# Altium footprint library Bison-Board.PcbLib: 101 footprints (part 1 of 7)
Each footprint in its own frame and in the unit in brackets; x right, y up, seen from the top. Pads: shape width x height; smd on the part's side, far side on the other; paste and mask are expansions set on the pad; w line width, h text height; cw(c..) or ccw(c..) is an arc to the next point about the centre after c.
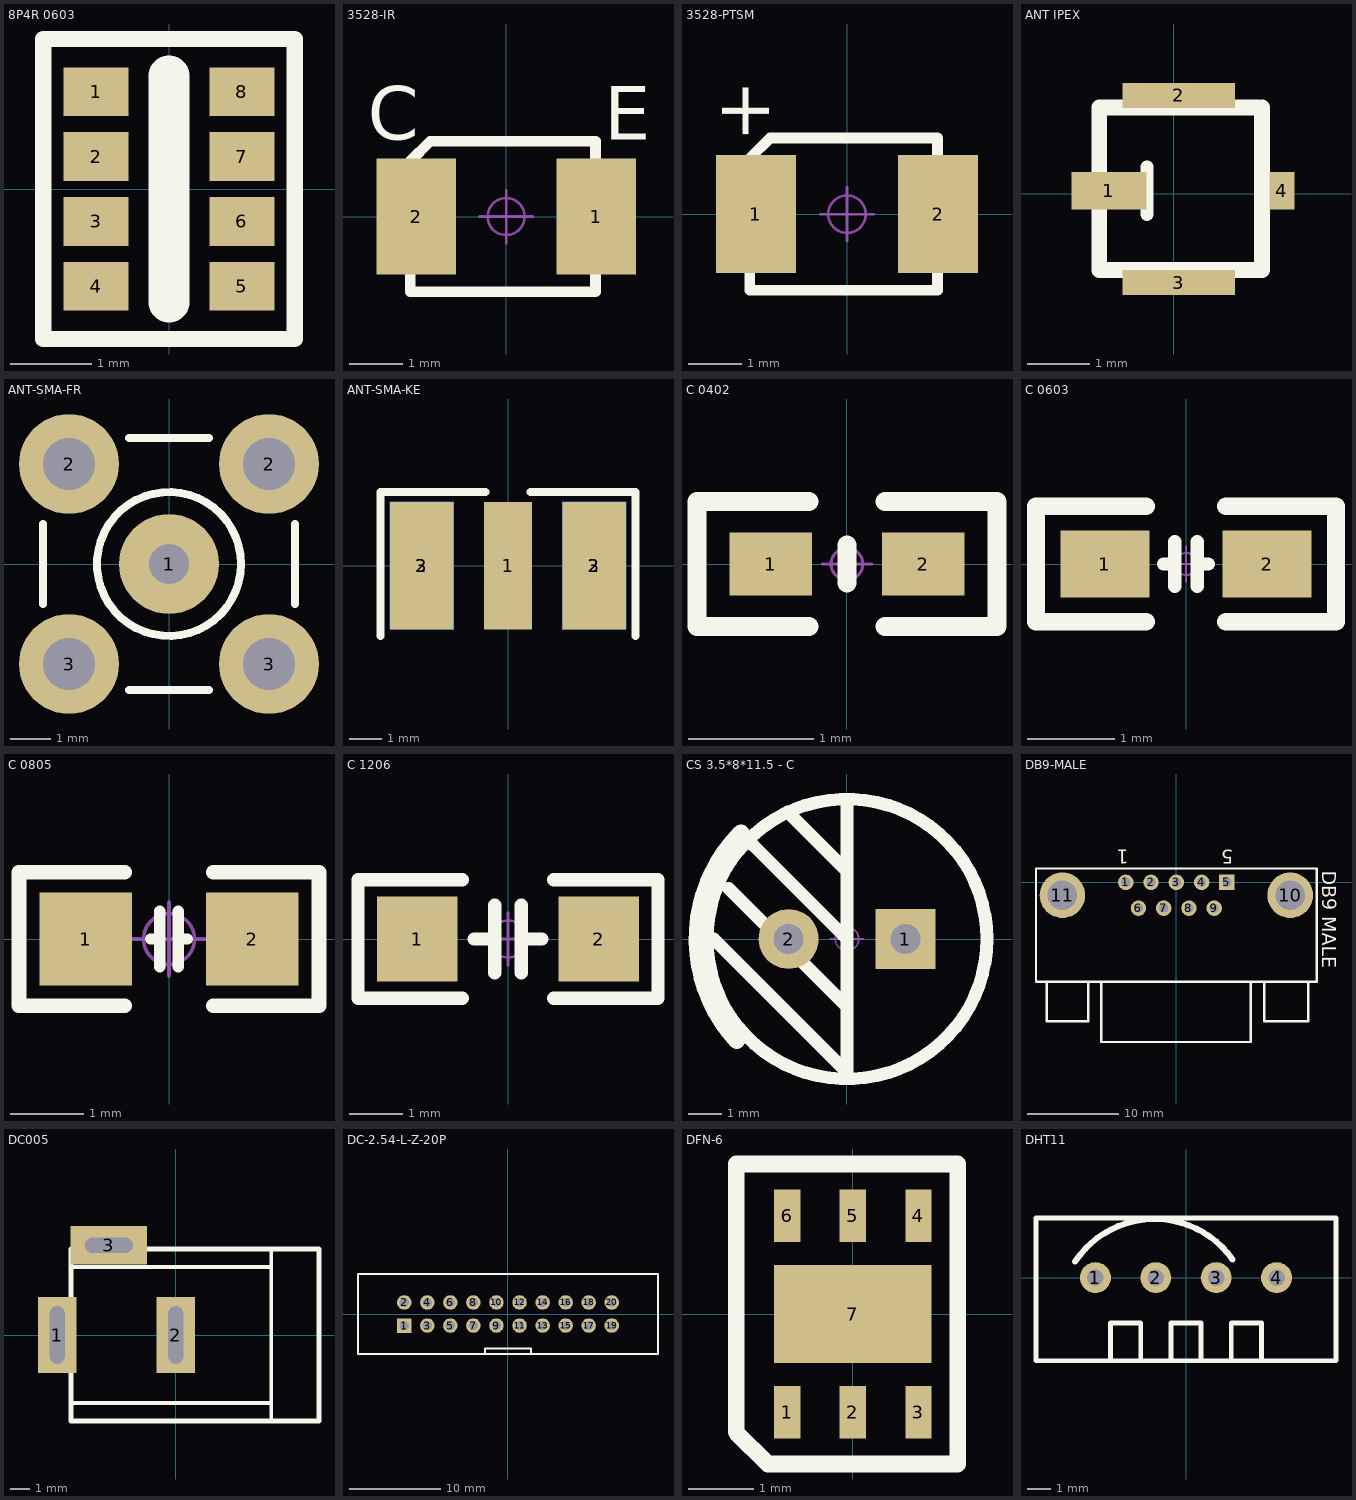
[diagram p0: the footprints below, top view; thin cyan lines are the x and y axes]

## 8P4R 0603 [mm]
pads (8):
  rect 0.8x0.6 smd: 1(-0.9,1.2) 2(-0.9,0.4) 3(-0.9,-0.4) 4(-0.9,-1.2) 5(0.9,-1.2) 6(0.9,-0.4) 7(0.9,0.4) 8(0.9,1.2)
Top Overlay:
  lines w0.2: -1.55,-1.85 1.55,-1.85 1.55,1.85 -1.55,1.85 -1.55,-1.85
  lines w0.5: 0,-1.397 0,1.397
3D body "8P4R-0603.SLDPRT": height 0.6, standoff 0, extent -0.863,-1.6 0.737,1.6

## 3528-IR [mm] "3528-2P封装的红外接收管"
pads (2):
  rect 1.5x2.2 smd: 1(1.7,0) 2(-1.7,0)
Top Overlay:
  lines w0.2: -1.816,-1.422 1.689,-1.422 1.689,1.422 -1.435,1.422 -1.816,1.041 -1.816,-1.422
  text "C" at -2.616,1.448 h1.02
  text "E" at 1.854,1.448 h1.02
Mechanical 15:
  circle w0.05: c0,0 r0.35
  lines w0.05: -0.5,0 0.5,0 ; 0,-0.5 0,0.5
3D body "LED 3528-2Pin 基体.STEP": height 1.95, standoff 0.05, extent -1.75,-1.4 1.75,1.4
3D body "LED 3528 透明胶.STEP": height 1.95, standoff 1.2, extent -1.195,-1.195 1.195,1.195

## 3528-PTSM [mm] "3528-2P封装的光环境传感器"
pads (2):
  rect 1.5x2.2 smd: 1(-1.7,0) 2(1.7,0)
Top Overlay:
  lines w0.2: -1.816,-1.422 1.689,-1.422 1.689,1.422 -1.435,1.422 -1.816,1.041 -1.816,-1.422
  text "+" at -1.448,1.346 h1.02
Mechanical 15:
  circle w0.05: c0,0 r0.35
  lines w0.05: -0.5,0 0.5,0 ; 0,-0.5 0,0.5
3D body "LED 3528-2Pin 基体.STEP": height 1.95, standoff 0.05, extent -1.75,-1.4 1.75,1.4
3D body "LED 3528 透明胶.STEP": height 1.95, standoff 1.2, extent -1.195,-1.195 1.195,1.195

## ANT IPEX [mm]
pads (4):
  rect 1.2x0.6 smd: 1(-1.041,0.051)
  rect 1.8x0.4 smd: 2(0.076,1.575) 3(0.076,-1.422)
  rect 0.4x0.6 smd: 4(1.727,0.051)
Top Overlay:
  lines w0.203: -1.067,0.051 -0.559,0.051 ; -0.432,-0.33 -0.432,0.432
  lines w0.254: 1.339,1.381 -1.194,1.381 -1.194,-1.219 1.406,-1.219 1.406,1.381
3D body "IPEX.SLDPRT": height 1.25, standoff 0, extent -1.473,-1.499 1.627,1.601

## ANT-SMA-FR [mm] "SMA天线座90度"
pads (5):
  round 2.5 hole 1: 1(0,0)
  round 2.5 hole 1.3: 2(-2.5,2.5) 2(2.5,2.5) 3(-2.5,-2.5) 3(2.5,-2.5)
Top Overlay:
  circle w0.2: c0,0 r1.8
  lines w0.2: -3.15,-1 -3.15,1 ; -1,-3.15 1,-3.15 ; -1,3.15 1,3.15 ; 3.15,-1 3.15,1
Mechanical 1:
  circle w0.025: c0,0 r0.2
  circle w0.025: c0,0 r1.05
  circle w0.025: c0,0 r1.8
3D body "Samtec-SMA-J-P-H-RA-TH1.STEP": height 10.26, standoff -3.84, extent -3.5,-3.5 3.5,11.6

## ANT-SMA-KE [mm]
pads (5):
  rect 1.5x4 smd: 1(0,0)
  rect 2x4 smd: 2(-2.7,0) 2(2.7,0)
  rect 2x4 smd far side: 3(-2.7,0) 3(2.7,0)
Top Overlay:
  lines w0.254: -4,-2.2 -4,2.3 -0.7,2.3 ; 0.7,2.3 4,2.3 4,-2.2
3D body "SMA-KE.STEP": height 3.75, standoff -2.76, extent -3.25,-1.3 3.25,12.2

## C 0402 [mil]
pads (2):
  rect 26x20 smd: 1(-24,0) 2(24,0)
Top Overlay:
  lines w6: -12,-19.68 -47.24,-19.68 -47.24,19.69 -12,19.69 ; 0,-6 0,6 ; 12,-19.68 47.25,-19.68 47.25,19.69 12,19.69
Mechanical 15:
  circle w1: c0,0 r5
  lines w1: -7.87,0 7.88,0 ; 0,-7.87 0,7.88
3D body "C0402.SLDPRT": height 12.2, standoff -0.39, extent -19.69,-10.24 19.68,10.23

## C 0603 [mil]
pads (2):
  rect 40x30 smd: 1(-36.5,0) 2(36.5,0)
Top Overlay:
  lines w6: -10,0 -5,0 ; -5,-10 -5,10 ; 5,-10 5,10 ; 5,0 10,0
  lines w8: -18,-26 -67.5,-26 -67.5,26 -18,26 ; 18,-26 67.5,-26 67.5,26 18,26
Mechanical 15:
  circle w1: c0,0 r5
  lines w1: -7.87,0 7.87,0 ; 0,-7.87 0,7.87
3D body "C0603.SLDPRT": height 16.54, standoff -0.79, extent -34.43,-17.07 36.43,16

## C 0805 [mil]
pads (2):
  rect 50x50 smd: 1(-45,0) 2(45,0)
Top Overlay:
  lines w6: -10,0 -5,0 ; -5,-15 -5,15 ; 5,-15 5,15 ; 5,0 10,0
  lines w8: -24,-36 -81,-36 -81,36 -24,36 ; 24,-36 81,-36 81,36 24,36
Mechanical 15:
  circle w1.97: c0,0 r13.78
  lines w1.97: -19.68,0 19.68,0 ; 0,-19.68 0,19.68
3D body "C0805.SLDPRT": height 20.08, standoff -0.39, extent -39.37,-25 39.37,25

## C 1206 [mil]
pads (2):
  rect 60x62.99 smd: 1(-67.5,0) 2(67.5,0)
Top Overlay:
  lines w10: -34,-44 -111.5,-44 -111.5,44 -34,44 ; -25,0 -10,0 ; -10,-25 -10,25 ; 10,-25 10,25 ; 10,0 25,0 ; 34,-44 111.5,-44 111.5,44 34,44
Mechanical 15:
  circle w1.97: c0,0 r13.78
  lines w1.97: -19.68,0 19.68,0 ; 0,-19.68 0,19.68
3D body "C 1206.STEP": height 47.64, standoff -0.39, extent -62.99,-31.89 62.99,31.89

## CS 3.5*8*11.5 - C [mm] "脚距3.5mm , 直径8mm , 高11.5mm"
pads (2):
  rect 1.8x1.8 hole 0.9: 1(1.75,0)
  round 1.8 hole 0.9: 2(-1.75,0)
Top Overlay:
  circle w0.381: c0,0 r4.2
  lines w0.381: -4,0 0,-4 0,4 ; -3.556,1.524 0,-2.032 ; -2.807,2.807 0,0 ; -1.778,3.81 0,2.032
  lines w0.504: -3.307,-3.053 cw(c0,0) -3.183,3.183
Mechanical 15:
  circle w0.05: c0,0 r0.35
  lines w0.05: -0.5,0 0.5,0 ; 0,-0.5 0,0.5
3D body "CS 8X11.5.STEP": height 11.52, standoff -3.48, extent -4,-4 4,4

## DB9-MALE [mm] "DB9公头"
pads (11):
  round 1.7 hole 1: 1(-5.546,0) 2(-2.773,0) 3(0,0) 4(2.773,0) 6(-4.155,-2.84) 7(-1.385,-2.84) 8(1.385,-2.84) 9(4.155,-2.84)
  rect 1.7x1.7 hole 1: 5(5.546,0)
  round 5 hole 3.25: 10(12.5,-1.42) 11(-12.5,-1.42)
Top Overlay:
  lines w0.254: -14.224,-10.922 -14.224,-15.24 -9.652,-15.24 -9.652,-10.922 ; -8.225,-10.922 -8.225,-17.526 8.175,-17.526 8.175,-10.922 ; 9.652,-10.922 9.652,-15.24 14.478,-15.24 14.478,-10.922 ; -15.4,-10.922 -15.4,1.524 15.4,1.524 15.4,-10.922 -15.4,-10.922
  text "DB9 MALE" at 16.002,1.27 h1.52
  text "1" at -5.207,3.556 h1.52
  text "5" at 6.223,3.556 h1.52
Mechanical 15:
  circle w0.05: c0,0 r0.35
  lines w0.05: -0.5,0 0.5,0 ; 0,-0.5 0,0.5
3D body "DB9 ĸ_A.STEP": height 12.65, standoff -3.16, extent -15.45,-17.247 15.45,1.253

## DC005 [mm] "DC005座子"
pads (3):
  rect 2x4 hole 0.8 slot 3 at 90 deg: 1(-6.2,0) 2(0,0)
  rect 4x2 hole 0.8 slot 2.5 at 0 deg: 3(-3.5,4.7)
Top Overlay:
  lines w0.2: -5.484,-3.556 5,-3.556 ; -5.484,3.556 5,3.556 ; 5,-4.5 5,4.5
  lines w0.254: -5.484,-4.5 7.5,-4.5 7.5,4.5 -5.484,4.5 -5.484,-4.5
3D body "dc-005.STEP": height 11.2, standoff -3.8, extent -6.55,-4.5 7.5,4.8

## DC-2.54-L-Z-20P [mm]
pads (20):
  rect 1.6x1.6 hole 1.02: 1(-11.43,-1.27)
  round 1.6 hole 1.02: 2(-11.43,1.27) 3(-8.89,-1.27) 4(-8.89,1.27) 5(-6.35,-1.27) 6(-6.35,1.27) 7(-3.81,-1.27) 8(-3.81,1.27) 9(-1.27,-1.27) 10(-1.27,1.27) 11(1.27,-1.27) 12(1.27,1.27) 13(3.81,-1.27) 14(3.81,1.27) 15(6.35,-1.27) 16(6.35,1.27) 17(8.89,-1.27) 18(8.89,1.27) 19(11.43,-1.27) 20(11.43,1.27)
Top Overlay:
  lines w0.254: -2.54,-4.4 -2.54,-3.81 2.54,-3.81 2.54,-4.4 ; -16.525,-4.4 16.525,-4.4 16.525,4.4 -16.525,4.4 -16.525,-4.4
3D body "2.54牛角插座2×10P.STEP": height 8.8, standoff -3.5, extent -16.525,-4.4 16.525,4.7

## DFN-6 [mm] "3*3mm"
pads (7):
  rect 0.4x0.8 smd: 1(-1,-1.5) 2(0,-1.5) 3(1,-1.5) 4(1,1.5) 5(0,1.5) 6(-1,1.5)
  rect 2.4x1.5 smd: 7(0,0)
Top Overlay:
  lines w0.254: -1.778,-1.803 -1.778,-0.406 -1.778,2.286 1.6,2.286 1.6,-2.286 -1.295,-2.286 -1.778,-1.803
3D body "SHT20.SLDPRT": height 1.1, standoff 0, extent -1.501,-1.5 1.499,1.5

## DHT11 [mm] "DHT11和DS18B20公用"
pads (4):
  round 1.3 hole 0.7: 1(-3.81,0) 2(-1.27,0) 3(1.27,0) 4(3.81,0)
Top Overlay:
  lines w0.203: -6.31,-3.5 3.81,-3.5 6.31,-3.5 ; -6.31,-3.46 -6.31,0 -6.31,2.5 3.81,2.5 6.31,2.5 6.31,0 6.31,-3.46 ; -3.175,-3.5 -3.175,-1.905 -1.905,-1.905 -1.905,-3.5 ; -0.635,-3.5 -0.635,-1.905 0.635,-1.905 0.635,-3.5 ; 1.905,-3.5 1.905,-1.905 3.175,-1.905 3.175,-3.5
  lines w0.254: -4.66,0.677 cw(c-1.321,-1.549) 1.962,0.759
3D body "DHT11.STEP": height 15.75, standoff -7.75, extent -6,-2.884 6,2.616